# Altium footprint library 00.PcbLib: 150 footprints (part 8 of 10)
Each footprint in its own frame and in the unit in brackets; x right, y up, seen from the top. Pads: shape width x height; smd on the part's side, far side on the other; paste and mask are expansions set on the pad; w line width, h text height; cw(c..) or ccw(c..) is an arc to the next point about the centre after c.
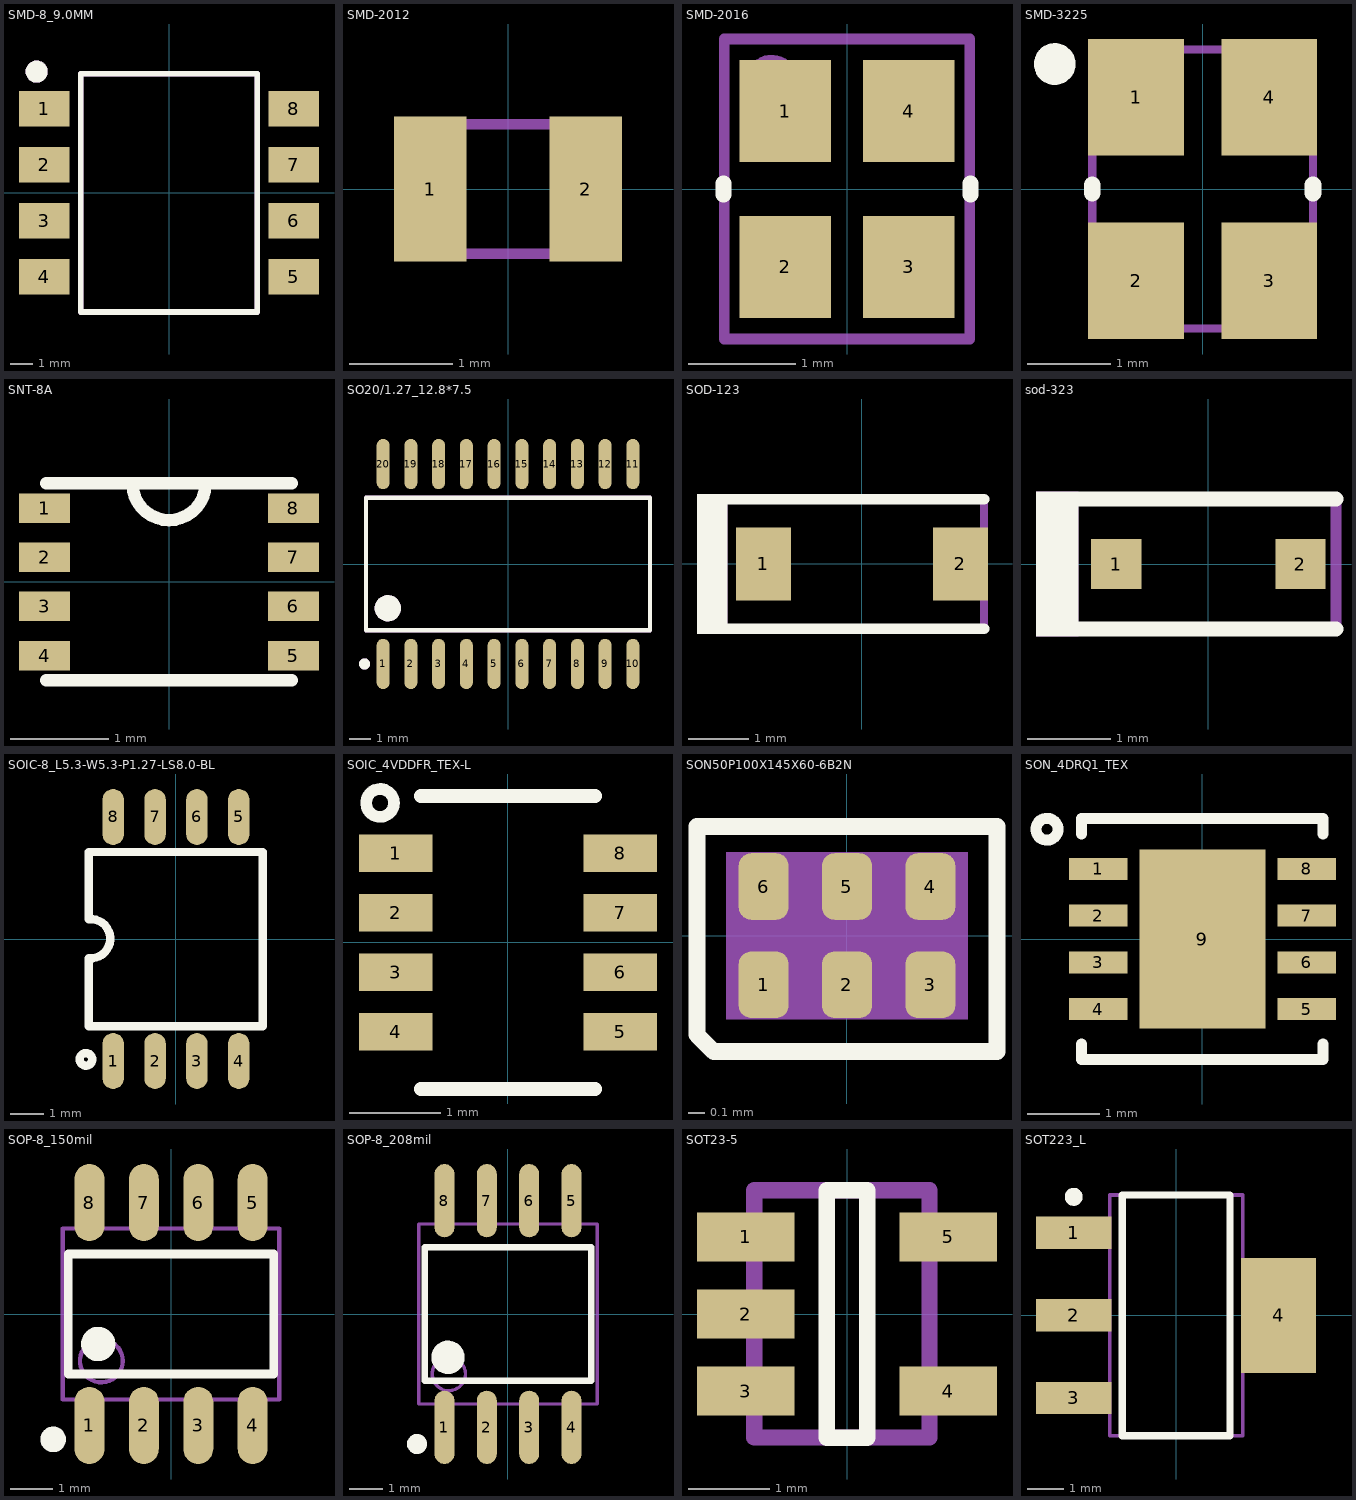
[diagram p7: the footprints below, top view; thin cyan lines are the x and y axes]

## SMD-8_9.0MM [mm]
pads (8):
  rect 2.3x1.6 smd: 1(-5.65,3.81) 2(-5.65,1.27) 3(-5.65,-1.27) 4(-5.65,-3.81) 5(5.65,-3.81) 6(5.65,-1.27) 7(5.65,1.27) 8(5.65,3.81)
Top Overlay:
  lines w0.254: -4,-5.4 -4,5.4 4,5.4 4,-5.4 -4,-5.4
  lines w0.5: -5.751,5.497 cw(c-6.001,5.498) -5.751,5.499
Top Component Outline (Mech100):
  lines w0.254: -4,-5.4 4,-5.4 4,5.4 -4,5.4 -4,-5.4
  lines w0.5: -5.751,5.497 cw(c-6.001,5.498) -5.751,5.499
3D body: height 4, standoff 0.4, extent -4.064,-5.334 4.064,5.334

## SMD-2012 [mm]
pads (2):
  rect 0.7x1.4 smd: 1(-0.75,0) 2(0.75,0)
Top Component Outline (Mech100):
  lines w0.1: -1.05,-0.625 -1.05,0.625 1.05,0.625 1.05,-0.625 -1.05,-0.625
3D body: height 0.6, standoff 0, extent -1.05,-0.625 1.05,0.625

## SMD-2016 [mm]
pads (4):
  rect 0.85x0.95 smd: 1(-0.575,0.725) 2(-0.575,-0.725) 3(0.575,-0.725) 4(0.575,0.725)
Top Overlay:
  lines w0.15: -1.15,-0.05 -1.15,0.05 ; 1.15,-0.05 1.15,0.05
Top Component Outline (Mech100):
  circle w0.1: c-0.7,1 r0.2
  lines w0.1: -1.143,-1.397 1.143,-1.397 1.143,1.397 -1.143,1.397 -1.143,-1.397
3D body: height 0.2, standoff 0, extent -1.143,-1.27 1.143,1.27
3D body: height 0.4, standoff 0.2, extent -1.143,-1.27 1.143,1.27
3D body: height 0.6, standoff 0.4, extent -1.016,-1.143 1.016,1.143
3D body: height 0.61, standoff 0.3, extent -0.899,0.801 -0.501,1.199

## SMD-3225 [mm]
pads (4):
  rect 1.15x1.4 smd: 1(-0.8,1.1) 2(-0.8,-1.1) 3(0.8,-1.1) 4(0.8,1.1)
Top Overlay:
  circle w0.25: c-1.775,1.5 r0.125
  lines w0.2: -1.325,-0.05 -1.325,0.05 ; 1.325,-0.05 1.325,0.05
Top 3D Body:
  circle w0.1: c-0.7,1 r0.2
Top Component Outline (Mech100):
  lines w0.1: -1.325,-1.675 -1.325,1.675 1.325,1.675 1.325,-1.675 -1.325,-1.675
3D body: height 0.4, standoff 0.2, extent -1.301,-1.65 1.3,1.65
3D body: height 0.6, standoff 0.4, extent -1.099,-1.449 1.099,1.449
3D body: height 0.2, standoff 0, extent -1.325,-1.675 1.325,1.675
3D body: height 0.61, standoff 0.3, extent -0.899,0.801 -0.501,1.199

## SNT-8A [mm]
pads (8):
  rect 0.52x0.3 smd mask+0: 1(-1.265,0.75) 2(-1.265,0.25) 3(-1.265,-0.25) 4(-1.265,-0.75) 5(1.265,-0.75) 6(1.265,-0.25) 7(1.265,0.25) 8(1.265,0.75)
Top Overlay:
  lines w0.127: -1.25,-1 1.25,-1 ; -1.25,1 1.25,1 ; -0.372,0.991 ccw(c0,1) 0.372,0.991

## SO20/1.27_12.8*7.5 [mm]
pads (20):
  oval 0.6x2.3 smd: 1(-5.715,-4.575) 2(-4.445,-4.575) 3(-3.175,-4.575) 4(-1.905,-4.575) 5(-0.635,-4.575) 6(0.635,-4.575) 7(1.905,-4.575) 8(3.175,-4.575) 9(4.445,-4.575) 10(5.715,-4.575) 11(5.715,4.575) 12(4.445,4.575) 13(3.175,4.575) 14(1.905,4.575) 15(0.635,4.575) 16(-0.635,4.575) 17(-1.905,4.575) 18(-3.175,4.575) 19(-4.445,4.575) 20(-5.715,4.575)
Top Overlay:
  circle w0.25: c-6.565,-4.575 r0.125
  circle w0.6: c-5.5,-2.025 r0.3
  lines w0.2: -6.5,-3.025 6.5,-3.025 6.5,3.025 -6.5,3.025 -6.5,-3.025
Top Component Outline (Mech100):
  circle w0.6: c-5.5,-2.025 r0.3
  circle w0.25: c-6.565,-4.575 r0.125
  lines w0.2: -6.5,-3.025 -6.5,3.025 6.5,3.025 6.5,-3.025 -6.5,-3.025
3D body "RW_20_ADI.step": height 2.64, standoff 0, extent -6.502,-5.321 6.502,5.321

## SOD-123 [mm]
pads (2):
  rect 0.915x1.22 smd: 1(-1.637,0) 2(1.637,0)
Top Overlay:
  rectangle: -2.743,-1.168 -2.235,1.168
  lines w0.178: -2.413,-1.079 2.032,-1.079 ; -2.413,1.079 2.032,1.079
Top Component Outline (Mech100):
  rectangle: -2.743,-1.168 -2.235,1.168
  lines w0.127: -2.413,-1.079 2.032,-1.079 2.032,1.079 -2.413,1.079
3D body "SOD-123.stp": height 1.35, standoff 0, extent -1.932,-0.9 1.932,0.9

## sod-323 [mm] "NXP recommended land pattern"
height 1.15
pads (2):
  rect 0.6x0.6 smd paste-0.05: 1(-1.1,0) 2(1.1,0)
Top Overlay:
  rectangle: -2.057,-0.864 -1.549,0.864
  lines w0.178: -1.803,-0.775 0.1,-0.775 1.525,-0.775 ; -1.803,0.775 0.1,0.775 1.525,0.775
Top Component Outline (Mech100):
  rectangle: -2.057,-0.864 -1.549,0.864
  lines w0.127: -1.803,-0.775 0.1,-0.775 1.525,-0.775 1.525,0.775 0.1,0.775 -1.803,0.775
3D body "SOD-323.stp": height 1.1, standoff 0, extent -1.3,-0.675 1.3,0.675

## SOIC-8_L5.3-W5.3-P1.27-LS8.0-BL [mm]
pads (8):
  oval 0.65x1.698 smd: 1(-1.905,-3.7) 2(-0.635,-3.7) 3(0.635,-3.7) 4(1.905,-3.7) 5(1.905,3.7) 6(0.635,3.7) 7(-0.635,3.7) 8(-1.905,3.7)
Top Overlay:
  circle w0.254: c-2.73,-3.65 r0.191
  lines w0.254: -2.64,-0.58 -2.64,-2 -2.64,-2.65 2.63,-2.65 2.63,2.64 -2.64,2.64 -2.64,2 -2.64,0.6 ; -2.63,-0.58 ccw(c-2.585,0.01) -2.63,0.6

## SOIC_4VDDFR_TEX-L [mil]
pads (8):
  rect 31.5x16 smd paste+0 mask+0: 1(-48.25,38.38) 2(-48.25,12.79) 3(-48.25,-12.79) 4(-48.25,-38.38) 5(48.25,-38.38) 6(48.25,-12.79) 7(48.25,12.79) 8(48.25,38.38)
Top Overlay:
  circle w5: c-55,60 r6
  lines w6: -37.5,-63 37.5,-63 ; -37.5,63 37.5,63
3D body "DDF0008A.stp": height 35.43, standoff 0, extent -55.5,-57.08 55.51,57.09

## SON50P100X145X60-6B2N [mm] "SON50P100X145X60-6B2N"
pads (6):
  rrect50% 0.3x0.4 smd: 1(-0.5,-0.295) 2(0,-0.295) 3(0.5,-0.295) 4(0.5,0.295) 5(0,0.295) 6(-0.5,0.295)
Top Overlay:
  lines w0.1: -0.9,-0.595 -0.9,0.655 0.9,0.655 0.9,-0.695 -0.8,-0.695 -0.9,-0.595
Top 3D Body:
  region: -0.725,-0.5 -0.725,0.5 0.725,0.5 0.725,-0.5
3D body: height 1, standoff 0, extent -0.725,-0.5 0.725,0.5

## SON_4DRQ1_TEX [mil]
pads (9):
  rect 32x12 smd paste+0 mask+0: 1(-57,38.38) 2(-57,12.79) 3(-57,-12.79) 4(-57,-38.38) 5(57,-38.38) 6(57,-12.79) 7(57,12.79) 8(57,38.38)
  rect 69x98 smd paste+0 mask+0: 9(0,0)
Top Overlay:
  circle w6: c-85,60 r6
  lines w6: -66,-57.48 -66,-66 66,-66 66,-57.48 ; -66,57.48 -66,66 66,66 66,57.48
3D body "SON_4DRQ1_TEX.step": height 39.09, standoff 0, extent -60.98,-60.98 60.99,60.99

## SOP-8_150mil [mm]
height 1.1
pads (8):
  oval 0.7x1.8 smd: 1(-1.905,-2.6) 2(-0.635,-2.6) 3(0.635,-2.6) 4(1.905,-2.6) 5(1.905,2.6) 6(0.635,2.6) 7(-0.635,2.6) 8(-1.905,2.6)
Top Overlay:
  circle w0.4: c-1.7,-0.7 r0.2
  circle w0.3: c-2.75,-2.925 r0.15
  lines w0.203: -2.4,-1.4 -2.4,1.4 2.4,1.4 2.4,-1.4 -2.4,-1.4
Top 3D Body:
  circle w0.1: c-1.625,-1.095 r0.5
  lines w0.1: -2.525,-1.995 -2.525,1.995 2.525,1.995 2.525,-1.995 -2.525,-1.995
3D body "User Library-SOIC-8-150.STEP": height 1.75, standoff 0, extent -2.5,-3.1 2.5,3.1

## SOP-8_208mil [mm]
height 1.1
pads (8):
  oval 0.6x2.2 smd: 1(-1.905,-3.4) 2(-0.635,-3.4) 3(0.635,-3.4) 4(1.905,-3.4) 5(1.905,3.4) 6(0.635,3.4) 7(-0.635,3.4) 8(-1.905,3.4)
Top Overlay:
  circle w0.3: c-2.73,-3.9 r0.15
  circle w0.5: c-1.8,-1.3 r0.25
  lines w0.2: -2.5,-2 -2.5,2 2.5,2 2.5,-2 -2.5,-2
Top 3D Body:
  circle w0.1: c-1.775,-1.8 r0.5
  lines w0.1: -2.675,-2.7 -2.675,2.7 2.675,2.7 2.675,-2.7 -2.675,-2.7

## SOT23-5 [mm]
pads (5):
  rect 1.2x0.6 smd: 1(-1.25,0.95) 2(-1.25,0) 3(-1.25,-0.95) 4(1.25,-0.95) 5(1.25,0.95)
Top Overlay:
  lines w0.2: -0.25,-1.525 0.25,-1.525 0.25,1.525 -0.25,1.525 -0.25,-1.525
Top Component Outline (Mech100):
  lines w0.2: -1.143,-1.524 1.016,-1.524 1.016,1.525 -1.143,1.525 -1.143,-1.524
3D body "DBV0005A.stp": height 1.09, standoff 0, extent -1.549,-1.461 1.296,1.46

## SOT223_L [mm] "SOT223, 4-Leads, Body 6.5x3.5mm, Pitch 2.3mm, Lead Span 7mm, IPC High Density"
height 1.7
pads (4):
  rect 2.1x0.9 smd: 1(-2.85,2.3) 2(-2.85,0) 3(-2.85,-2.3)
  rect 2.1x3.2 smd: 4(2.85,0)
Top Overlay:
  circle w0.25: c-2.85,3.3 r0.125
  lines w0.2: -1.5,-3.35 -1.5,3.35 1.5,3.35 1.5,-3.35 -1.5,-3.35
Top 3D Body:
  lines w0.1: -1.85,-3.35 -1.85,3.35 1.85,3.35 1.85,-3.35 -1.85,-3.35
3D body "User Library-SOT-223-2.STEP": height 1.85, standoff -0.05, extent -3.421,-3.397 3.783,3.303